# Altium footprint library HoangLong_Library.PcbLib: 81 footprints (part 6 of 6)
Each footprint in its own frame and in the unit in brackets; x right, y up, seen from the top. Pads: shape width x height; smd on the part's side, far side on the other; paste and mask are expansions set on the pad; w line width, h text height; cw(c..) or ccw(c..) is an arc to the next point about the centre after c.
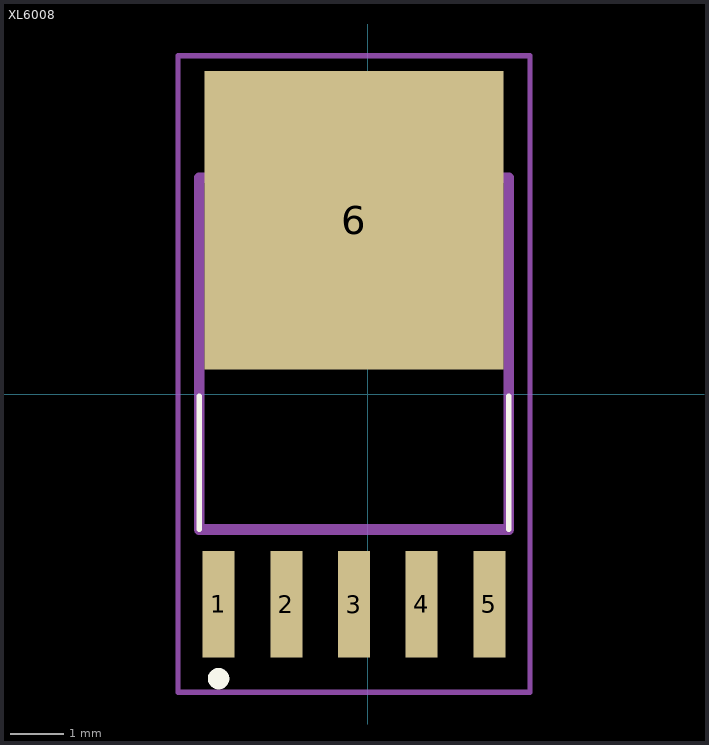
[diagram p5: the footprint, top view; thin cyan lines are the x and y axes]

## XL6008 [mm]
pads (6):
  rect 0.6x2 smd: 1(-2.794,-3.937) 2(-1.524,-3.937) 3(-0.254,-3.937) 4(1.016,-3.937) 5(2.286,-3.937)
  rect 5.6x5.6 smd: 6(-0.254,3.263)
Top Overlay:
  lines w0.1: -3.154,-2.537 -3.154,-0.037 -3.154,-2.537 ; 2.646,-2.537 2.646,-0.037 2.646,-2.537
  lines w0.2: -2.894,-5.334 ccw(c-2.794,-5.334) -2.694,-5.334 ; -2.894,-5.334 cw(c-2.794,-5.334) -2.694,-5.334 ; -2.894,-5.334 ccw(c-2.794,-5.334) -2.694,-5.334
Mechanical 13:
  lines w0.1: -3.556,-5.588 3.048,-5.588 3.048,6.35 -3.556,6.35 -3.556,-5.588
  lines w0.2: -3.154,-2.537 2.646,-2.537 2.646,4.063 -3.154,4.063 -3.154,-2.537
3D body "MIC5295-3.3YD--3DModel-STEP-510211.STEP": height 2.39, standoff 0, extent -3.505,-4.317 2.997,5.588